# Altium footprint library VITA_57_FMC.PcbLib: 20 footprints (part 2 of 2)
Each footprint in its own frame and in the unit in brackets; x right, y up, seen from the top. Pads: shape width x height; smd on the part's side, far side on the other; paste and mask are expansions set on the pad; w line width, h text height; cw(c..) or ccw(c..) is an arc to the next point about the centre after c.
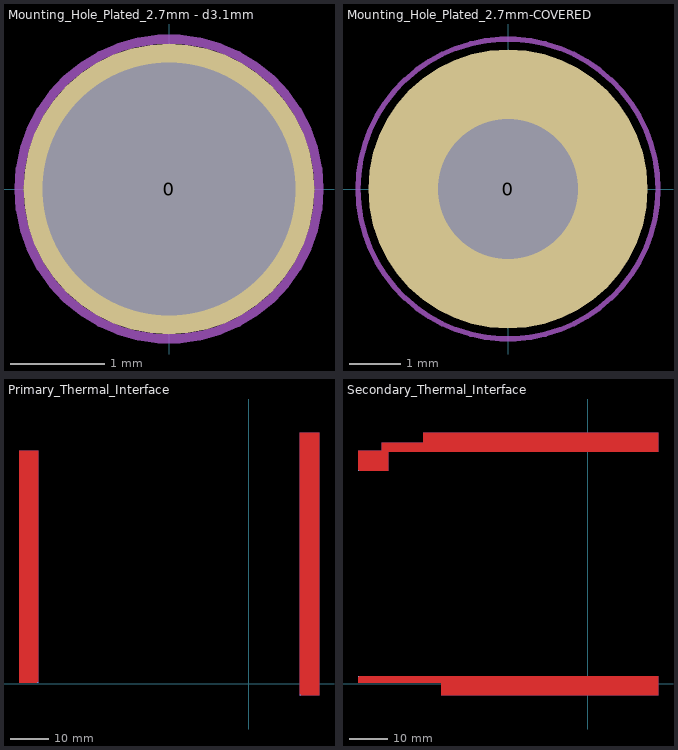
[diagram p1: the footprints below, top view; thin cyan lines are the x and y axes]

## Mounting_Hole_Plated_2.7mm - d3.1mm [mm] "Mounting Hole, hole 2.7mm, diameter 3.1mm, Keepout R 3.2mm, plated"
pads (1):
  round 3.1 hole 2.7 mask+0: 0(0,0)
Mechanical 1:
  circle w0.1: c0,0 r1.6

## Mounting_Hole_Plated_2.7mm-COVERED [mm] "Mounting Hole, hole 2.7mm, diameter 5.4mm, Keepout R 2.9mm, plated, covered with solder mask"
pads (1):
  round 5.4 hole 2.7 mask+0.2: 0(0,0)
Mechanical 1:
  circle w0.1: c0,0 r2.9

## Primary_Thermal_Interface [mil] "Primary thermal interfaces for FMC module"
pads (4):
  round 6 smd paste-5.98 mask+0: 0(-2184.25,14.96) 1(530.71,-114.96)
  round 6 smd far side paste-5.98 mask+0: 0(-2184.25,14.96) 1(530.71,-114.96)
Top Layer:
  region: 724.41,2598.43 527.56,2598.43 527.56,-118.11 724.41,-118.11
  region: -2377.95,11.81 -2377.95,2413.39 -2181.1,2413.39 -2181.1,11.81
Bottom Layer:
  region: 527.56,2598.43 724.41,2598.43 724.41,-118.11 527.56,-118.11
  region: -2377.95,2413.39 -2181.1,2413.39 -2181.1,11.81 -2377.95,11.81

## Secondary_Thermal_Interface [mil] "Secondary thermal interfaces for FMC module"
pads (4):
  round 6 smd paste-5.98 mask+0: 0(-2374.8,2207.87) 1(-2374.8,75.59)
  round 6 smd far side paste-5.98 mask+0: 0(-2374.8,2207.87) 1(-2374.8,75.59)
Top Layer:
  region: 724.41,2598.43 724.41,2401.57 -2062.99,2401.57 -2062.99,2204.72 -2377.95,2204.72 -2377.95,2413.39 -2129.92,2413.39 -2129.92,2496.06 -1704.72,2496.06 -1704.72,2598.43
  region: 724.41,-118.11 724.41,78.74 -2377.95,78.74 -2377.95,11.81 -1515.75,11.81 -1515.75,-118.11
Bottom Layer:
  region: 724.41,2598.43 724.41,2401.57 -2062.99,2401.57 -2062.99,2204.72 -2377.95,2204.72 -2377.95,2413.39 -2129.92,2413.39 -2129.92,2496.06 -1704.72,2496.06 -1704.72,2598.43
  region: 724.41,-118.11 724.41,78.74 -2377.95,78.74 -2377.95,11.81 -1515.75,11.81 -1515.75,-118.11